# Altium footprint library pcb.PcbLib: 397 footprints (part 9 of 25)
Each footprint in its own frame and in the unit in brackets; x right, y up, seen from the top. Pads: shape width x height; smd on the part's side, far side on the other; paste and mask are expansions set on the pad; w line width, h text height; cw(c..) or ccw(c..) is an arc to the next point about the centre after c.
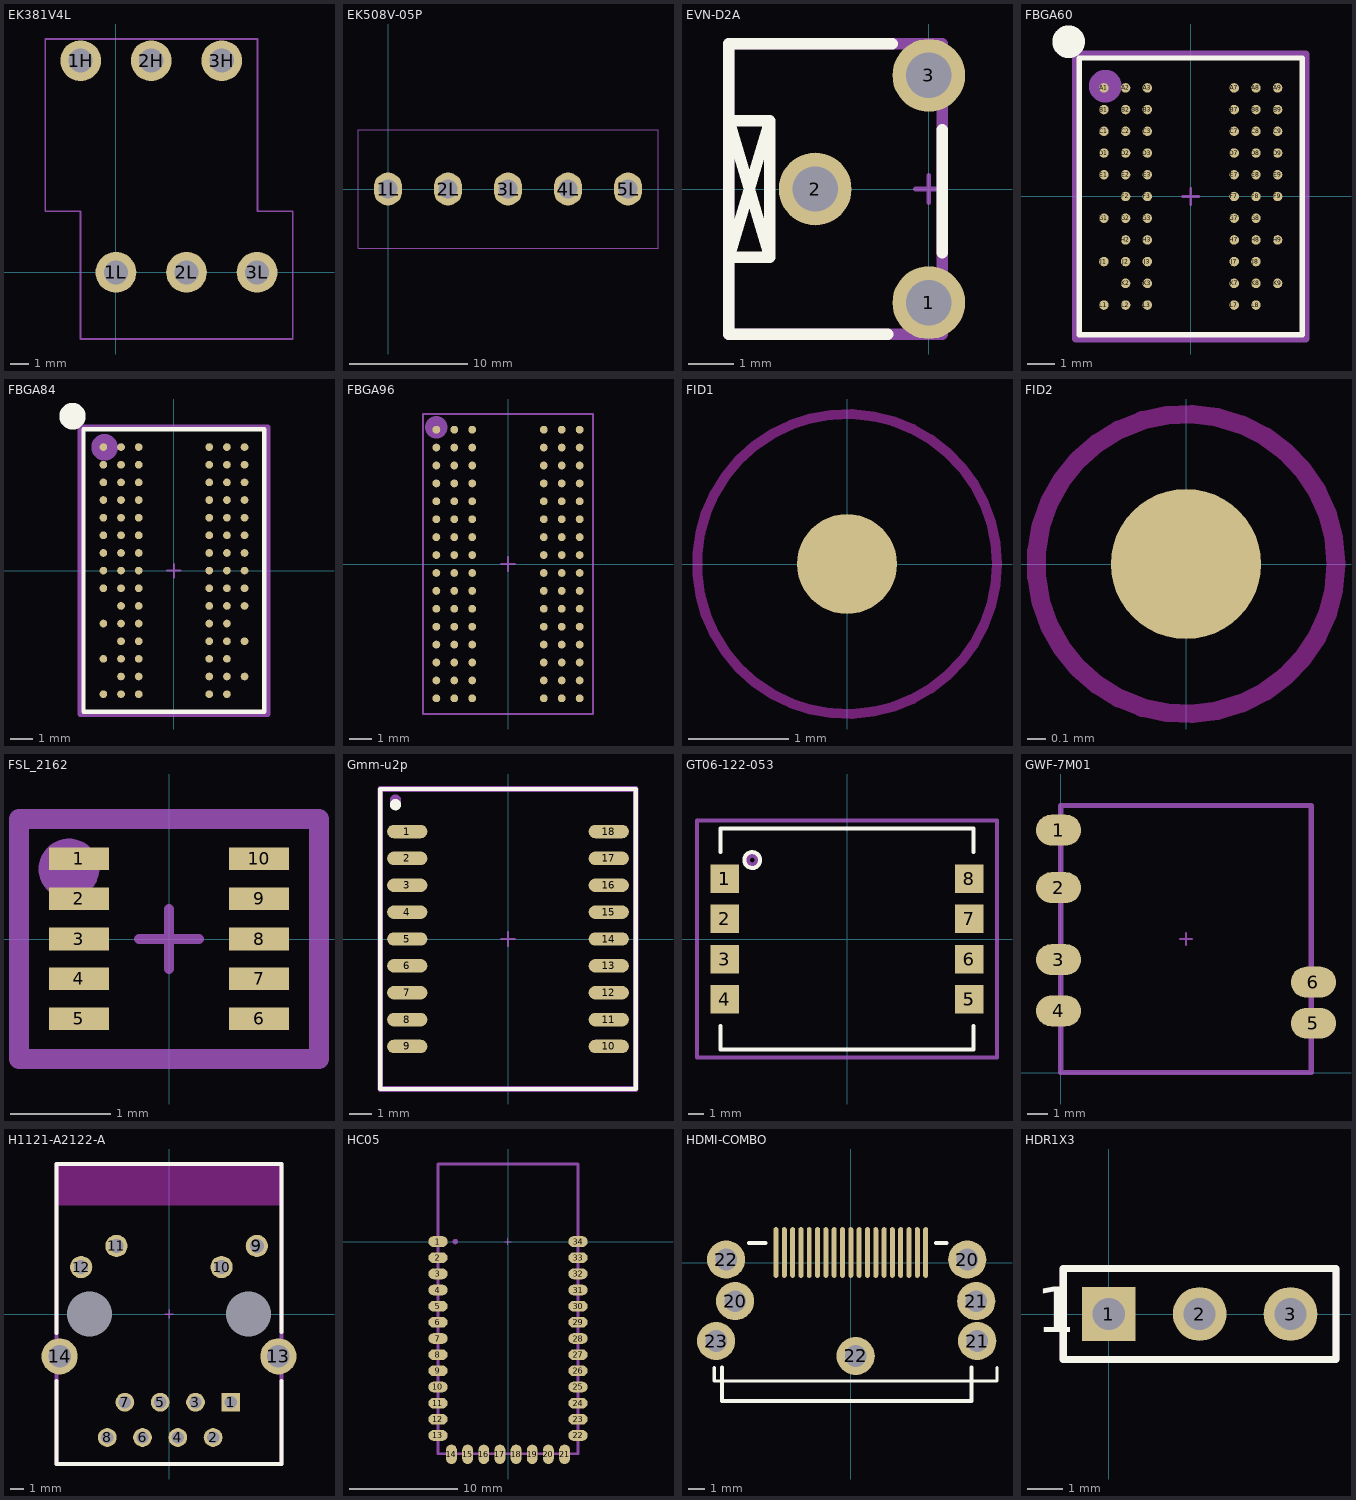
[diagram p8: the footprints below, top view; thin cyan lines are the x and y axes]

## EK381V4L [mm]
height 16.2
pads (6):
  round 2.2 hole 1.3: 1H(-1.905,11.43) 1L(0,0) 2H(1.905,11.43) 2L(3.81,0) 3H(5.715,11.43) 3L(7.62,0)
Mechanical 15:
  lines w0.1: -0.3,0 0.3,0 ; 0,-0.3 0,0.3 ; -3.82,3.3 -3.82,12.6 7.64,12.6 7.64,3.3 9.55,3.3 9.55,-3.6 -1.91,-3.6 -1.91,3.3 -3.82,3.3
  text ".Designator" at -1.3,-2.9 h1.02
3D body "EK381V4L.stp": height 16.2, standoff -3.5, extent -3.8,-3.6 9.54,12.6

## EK508V-05P [mm]
height 16.2
pads (5):
  oval 2.4x2.8 hole 1.6: 1L(0,0) 2L(5.08,0) 3L(10.16,0) 4L(15.24,0) 5L(20.32,0)
Mechanical 15:
  lines w0.1: -0.3,0 0.3,0 ; 0,-0.3 0,0.3 ; -2.54,-5 -2.54,5 22.86,5 22.86,-5 -2.54,-5
  text ".Designator" at -1.3,-2.9 h1.02
3D body: height 13.8, standoff 0, extent -2.54,-5 22.86,5

## EVN-D2A [mm]
height 8
pads (3):
  round 1.6 hole 1: 1(0,-2.5) 2(-2.5,0) 3(0,2.5)
Top Overlay:
  lines w0.25: -3.5,-1.5 -4.4,1.5 -3.5,1.5 ; -3.5,-1.5 -4.4,-1.5 -3.5,1.5 ; -3.5,-1.5 -3.5,1.5
  lines w0.254: -0.9,-3.2 -4.4,-3.2 -4.4,3.2 -0.8,3.2 ; 0.3,-1.4 0.3,1.3
Mechanical 15:
  lines w0.1: -0.3,0 0.3,0 ; 0,-0.3 0,0.3
  lines w0.254: -4.4,-3.2 0.3,-3.2 0.3,2 0.3,3.2 -4.4,3.2 -4.4,-3.2
  text ".Designator" at -1.1,-2.7 h1.02
3D body: height 8, standoff 0, extent -4.4,-3.2 0.3,3.2

## FBGA60 [mm]
height 1
pads (60):
  round 0.35 smd paste+0 mask+0.075: A1(-3.2,4) A2(-2.4,4) A3(-1.6,4) A7(1.6,4) A8(2.4,4) A9(3.2,4) B1(-3.2,3.2) B2(-2.4,3.2) B3(-1.6,3.2) B7(1.6,3.2) B8(2.4,3.2) B9(3.2,3.2) C1(-3.2,2.4) C2(-2.4,2.4) C3(-1.6,2.4) C7(1.6,2.4) C8(2.4,2.4) C9(3.2,2.4) D1(-3.2,1.6) D2(-2.4,1.6) D3(-1.6,1.6) D7(1.6,1.6) D8(2.4,1.6) D9(3.2,1.6) E1(-3.2,0.8) E2(-2.4,0.8) E3(-1.6,0.8) E7(1.6,0.8) E8(2.4,0.8) E9(3.2,0.8) F2(-2.4,0) F3(-1.6,0) F7(1.6,0) F8(2.4,0) F9(3.2,0) G1(-3.2,-0.8) G2(-2.4,-0.8) G3(-1.6,-0.8) G7(1.6,-0.8) G8(2.4,-0.8) H2(-2.4,-1.6) H3(-1.6,-1.6) H7(1.6,-1.6) H8(2.4,-1.6) H9(3.2,-1.6) J1(-3.2,-2.4) J2(-2.4,-2.4) J3(-1.6,-2.4) J7(1.6,-2.4) J8(2.4,-2.4) K2(-2.4,-3.2) K3(-1.6,-3.2) K7(1.6,-3.2) K8(2.4,-3.2) K9(3.2,-3.2) L1(-3.2,-4) L2(-2.4,-4) L3(-1.6,-4) L7(1.6,-4) L8(2.4,-4)
Top Overlay:
  circle w1: c-4.5,5.7 r0.1
  lines w0.2: -4.1,-5.1 -4.1,5.1 4.1,5.1 4.1,-5.1 -4.1,-5.1
Mechanical 15:
  circle w1: c-3.148,4.064 r0.1
  lines w0.1: -0.3,0 0.3,0 ; 0,-0.3 0,0.3
  lines w0.254: -4.25,-5.25 -4.25,5.25 4.25,5.25 4.25,-5.25 -4.25,-5.25
  text ".Designator" at -3.556,2.286 h1.02
3D body: height 1.55, standoff 0, extent -4,-5 4,5

## FBGA84 [mm]
height 1
pads (84):
  round 0.35 smd paste+0 mask+0.075: A1(-3.2,5.6) A2(-2.4,5.6) A3(-1.6,5.6) A7(1.6,5.6) A8(2.4,5.6) A9(3.2,5.6) B1(-3.2,4.8) B2(-2.4,4.8) B3(-1.6,4.8) B7(1.6,4.8) B8(2.4,4.8) B9(3.2,4.8) C1(-3.2,4) C2(-2.4,4) C3(-1.6,4) C7(1.6,4) C8(2.4,4) C9(3.2,4) D1(-3.2,3.2) D2(-2.4,3.2) D3(-1.6,3.2) D7(1.6,3.2) D8(2.4,3.2) D9(3.2,3.2) E1(-3.2,2.4) E2(-2.4,2.4) E3(-1.6,2.4) E7(1.6,2.4) E8(2.4,2.4) E9(3.2,2.4) F1(-3.2,1.6) F2(-2.4,1.6) F3(-1.6,1.6) F7(1.6,1.6) F8(2.4,1.6) F9(3.2,1.6) G1(-3.2,0.8) G2(-2.4,0.8) G3(-1.6,0.8) G7(1.6,0.8) G8(2.4,0.8) G9(3.2,0.8) H1(-3.2,0) H2(-2.4,0) H3(-1.6,0) H7(1.6,0) H8(2.4,0) H9(3.2,0) J1(-3.2,-0.8) J2(-2.4,-0.8) J3(-1.6,-0.8) J7(1.6,-0.8) J8(2.4,-0.8) J9(3.2,-0.8) K2(-2.4,-1.6) K3(-1.6,-1.6) K7(1.6,-1.6) K8(2.4,-1.6) K9(3.2,-1.6) L1(-3.2,-2.4) L2(-2.4,-2.4) L3(-1.6,-2.4) L7(1.6,-2.4) L8(2.4,-2.4) M2(-2.4,-3.2) M3(-1.6,-3.2) M7(1.6,-3.2) M8(2.4,-3.2) M9(3.2,-3.2) N1(-3.2,-4) N2(-2.4,-4) N3(-1.6,-4) N7(1.6,-4) N8(2.4,-4) P2(-2.4,-4.8) P3(-1.6,-4.8) P7(1.6,-4.8) P8(2.4,-4.8) P9(3.2,-4.8) R1(-3.2,-5.6) R2(-2.4,-5.6) R3(-1.6,-5.6) R7(1.6,-5.6) R8(2.4,-5.6)
Top Overlay:
  circle w1: c-4.6,7 r0.1
  lines w0.2: -4.1,-6.4 4.1,-6.4 4.1,6.4 -4.1,6.4 -4.1,-6.4
Mechanical 15:
  circle w1: c-3.148,5.588 r0.1
  lines w0.1: -0.3,0 0.3,0 ; 0,-0.3 0,0.3
  lines w0.254: -4.25,-6.5 -4.25,6.5 4.25,6.5 4.25,-6.5 -4.25,-6.5
  text ".Designator" at -3.556,3.302 h1.02
3D body: height 1.55, standoff 0, extent -4,-6.3 4,6.3

## FBGA96 [mm]
pads (96):
  round 0.35 smd paste+0 mask+0.075: A1(-3.2,6) A2(-2.4,6) A3(-1.6,6) A7(1.6,6) A8(2.4,6) A9(3.2,6) B1(-3.2,5.2) B2(-2.4,5.2) B3(-1.6,5.2) B7(1.6,5.2) B8(2.4,5.2) B9(3.2,5.2) C1(-3.2,4.4) C2(-2.4,4.4) C3(-1.6,4.4) C7(1.6,4.4) C8(2.4,4.4) C9(3.2,4.4) D1(-3.2,3.6) D2(-2.4,3.6) D3(-1.6,3.6) D7(1.6,3.6) D8(2.4,3.6) D9(3.2,3.6) E1(-3.2,2.8) E2(-2.4,2.8) E3(-1.6,2.8) E7(1.6,2.8) E8(2.4,2.8) E9(3.2,2.8) F1(-3.2,2) F2(-2.4,2) F3(-1.6,2) F7(1.6,2) F8(2.4,2) F9(3.2,2) G1(-3.2,1.2) G2(-2.4,1.2) G3(-1.6,1.2) G7(1.6,1.2) G8(2.4,1.2) G9(3.2,1.2) H1(-3.2,0.4) H2(-2.4,0.4) H3(-1.6,0.4) H7(1.6,0.4) H8(2.4,0.4) H9(3.2,0.4) J1(-3.2,-0.4) J2(-2.4,-0.4) J3(-1.6,-0.4) J7(1.6,-0.4) J8(2.4,-0.4) J9(3.2,-0.4) K1(-3.2,-1.2) K2(-2.4,-1.2) K3(-1.6,-1.2) K7(1.6,-1.2) K8(2.4,-1.2) K9(3.2,-1.2) L1(-3.2,-2) L2(-2.4,-2) L3(-1.6,-2) L7(1.6,-2) L8(2.4,-2) L9(3.2,-2) M1(-3.2,-2.8) M2(-2.4,-2.8) M3(-1.6,-2.8) M7(1.6,-2.8) M8(2.4,-2.8) M9(3.2,-2.8) N1(-3.2,-3.6) N2(-2.4,-3.6) N3(-1.6,-3.6) N7(1.6,-3.6) N8(2.4,-3.6) N9(3.2,-3.6) P1(-3.2,-4.4) P2(-2.4,-4.4) P3(-1.6,-4.4) P7(1.6,-4.4) P8(2.4,-4.4) P9(3.2,-4.4) R1(-3.2,-5.2) R2(-2.4,-5.2) R3(-1.6,-5.2) R7(1.6,-5.2) R8(2.4,-5.2) R9(3.2,-5.2) T1(-3.2,-6) T2(-2.4,-6) T3(-1.6,-6) T7(1.6,-6) T8(2.4,-6) T9(3.2,-6)
Mechanical 15:
  circle w1: c-3.2,6.1 r0
  lines w0.1: -0.3,0 0.3,0 ; 0,-0.3 0,0.3 ; -3.8,-6.7 -3.8,6.7 3.8,6.7 3.8,-6.7 -3.8,-6.7
  text ".Designator" at -3.6,4.4 h1.02
3D body: height 1.55, standoff 0, extent -3.8,-6.7 3.8,6.7

## FID1 [mm]
pads (1):
  round 1 smd paste-25.4 mask+1: ""(0,0)
Top Layer keep-out:
  circle w0.1: c0,0 r1.5

## FID2 [mm]
pads (1):
  round 0.8 smd paste-500 mask+0.4: ""(0,0)
Top Layer keep-out:
  circle w0.1: c0,0 r0.8

## FSL_2162 [mm]
height 0.8
pads (10):
  rect 0.6x0.225 smd paste-0.02 mask+0.1: 1(-0.9,0.8) 2(-0.9,0.4) 3(-0.9,0) 4(-0.9,-0.4) 5(-0.9,-0.8) 6(0.9,-0.8) 7(0.9,-0.4) 8(0.9,0) 9(0.9,0.4) 10(0.9,0.8)
Mechanical 15:
  circle w0.406: c-1,0.7 r0.1
  lines w0.1: -0.3,0 0.3,0 ; 0,-0.3 0,0.3
  lines w0.2: -1.5,-1.2 1.5,-1.2 1.5,1.2 -1.5,1.2 -1.5,-1.2
  text ".Designator" at -1.3,-0.9 h0.5
3D body: height 0.85, standoff 0, extent -1,-1 1,1

## Gmm-u2p [mm]
height 1.8
pads (18):
  oval 1.8x0.6 smd: 1(-4.5,4.8) 2(-4.5,3.6) 3(-4.5,2.4) 4(-4.5,1.2) 5(-4.5,0) 6(-4.5,-1.2) 7(-4.5,-2.4) 8(-4.5,-3.6) 9(-4.5,-4.8) 10(4.5,-4.8) 11(4.5,-3.6) 12(4.5,-2.4) 13(4.5,-1.2) 14(4.5,0) 15(4.5,1.2) 16(4.5,2.4) 17(4.5,3.6) 18(4.5,4.8)
Top Overlay:
  circle w0.25: c-5.025,6 r0.125
  lines w0.2: -5.7,-6.7 -5.7,6.7 5.7,6.7 5.7,-6.7 -5.7,-6.7
Mechanical 15:
  circle w0.25: c-5.025,6.2 r0.125
  lines w0.1: -0.3,0 0.3,0 ; 0,-0.3 0,0.3
  lines w0.254: -5.7,-6.7 5.7,-6.7 5.7,6.7 -5.7,6.7 -5.7,-6.7
  text ".Designator" at -5.1,-5.2 h1.02
3D body: height 2.1, standoff 0, extent -4.5,-6.4 4.5,6.4

## GT06-122-053 [mm] "Pulse Transformers Gate Drive Transformer"
pads (10):
  rect 1.8x1.8 smd: 1(-7.75,3.81) 1(-7.75,3.81) 2(-7.75,1.27) 3(-7.75,-1.27) 4(-7.75,-3.81) 5(7.75,-3.81) 5(7.75,-3.81) 6(7.75,-1.27) 7(7.75,1.27) 8(7.75,3.81)
Top Overlay:
  circle w0.254: c-6,5 r0.5
  lines w0.254: -8,-5.5 -8,-7 8,-7 8,-5.5 ; -8,5.5 -8,7 8,7 8,5.5
Mechanical 15:
  circle w0.3: c-6,5 r0.3
  lines w0.254: 7.2,7.5 9.5,7.5 9.5,-7.5 8.9,-7.5 -9.5,-7.5 -9.5,5.5 -9.5,7.5 8,7.5
  text ".Designator" at -5.1,2.3 h1.02
  text "1" at -6.1,3.2 h1.02
3D body: height 7.5, standoff 0.5, extent -7.747,-6.985 7.747,6.985

## GWF-7M01 [mm]
height 2
pads (6):
  oval 2.2x1.5 smd: 1(-0.1,11.8) 2(-0.1,9) 3(-0.1,5.5) 4(-0.1,3) 5(12.3,2.4) 6(12.3,4.4)
Mechanical 15:
  lines w0.1: 5.8,6.5 6.4,6.5 ; 6.1,6.2 6.1,6.8
  lines w0.254: 0,0 0,13 12.2,13 12.2,0 0,0
  text ".Designator" at 1.2,3.3 h1.02
3D body: height 2, standoff 0, extent 0,0 12.2,13

## H1121-A2122-A [mm]
height 13.8
pads (16):
  rect 1.35x1.35 hole 0.89: 1(4.445,-6.35)
  round 1.35 hole 0.89: 2(3.175,-8.89) 3(1.905,-6.35) 4(0.635,-8.89) 5(-0.635,-6.35) 6(-1.905,-8.89) 7(-3.175,-6.35) 8(-4.445,-8.89)
  round 1.6 hole 1: 9(6.325,4.9) 10(3.785,3.38) 11(-3.785,4.9) 12(-6.325,3.38)
  round 2.6 hole 1.63: 13(7.875,-3.05) 14(-7.875,-3.05)
  round 0 hole 3.25 unplated: ""(-5.715,0) ""(5.715,0)
Top Layer keep-out:
  region: 8.1,10.8 -8.1,10.8 -8.1,7.8 8.1,7.8
Top Overlay:
  lines w0.254: -8.1,-4.82 -8.1,-10.8 8.1,-10.8 8.1,-4.82 ; -8.1,-1.4 -8.1,10.8 8.1,10.8 8.1,-1.3
Mechanical 15:
  lines w0.1: -0.3,0 0.3,0 ; 0,-0.3 0,0.3
  lines w0.254: -8.1,-10.8 -8.1,10.8 8.1,10.8 8.1,-10.8 -8.1,-10.8
  text ".Designator" at -5.1,-4.5 h1.02

## HC05 [mm]
height 1.8
pads (34):
  oval 1.8x1 smd: 1(-6.5,0) 2(-6.5,-1.5) 3(-6.5,-3) 4(-6.5,-4.5) 5(-6.5,-6) 6(-6.5,-7.5) 7(-6.5,-9) 8(-6.5,-10.5) 9(-6.5,-12) 10(-6.5,-13.5) 11(-6.5,-15) 12(-6.5,-16.5) 13(-6.5,-18) 22(6.5,-18) 23(6.5,-16.5) 24(6.5,-15) 25(6.5,-13.5) 26(6.5,-12) 27(6.5,-10.5) 28(6.5,-9) 29(6.5,-7.5) 30(6.5,-6) 31(6.5,-4.5) 32(6.5,-3) 33(6.5,-1.5) 34(6.5,0)
  oval 1x1.8 smd: 14(-5.25,-19.75) 15(-3.75,-19.75) 16(-2.25,-19.75) 17(-0.75,-19.75) 18(0.75,-19.75) 19(2.25,-19.75) 20(3.75,-19.75) 21(5.25,-19.75)
Mechanical 15:
  circle w0.25: c-4.9,0 r0.125
  lines w0.1: -0.3,0 0.3,0 ; 0,-0.3 0,0.3
  lines w0.254: -6.5,-19.7 6.5,-19.7 6.5,7.2 -6.5,7.2 -6.5,-19.7
  text ".Designator" at -4.3,-7 h1.02
3D body "User Library-Bluetooth HC-06_.STEP": height 2.35, standoff 0, extent -7.02,-19.75 7,8.26

## HDMI-COMBO [mm]
height 8.5
pads (26):
  oval 0.3x3.05 smd: 1(4.5,0.625) 2(4,0.625) 3(3.5,0.625) 4(3,0.625) 5(2.5,0.625) 6(2,0.625) 7(1.5,0.625) 8(1,0.625) 9(0.5,0.625) 10(0,0.625) 11(-0.5,0.625) 12(-1,0.625) 13(-1.5,0.625) 14(-2,0.625) 15(-2.5,0.625) 16(-3,0.625) 17(-3.5,0.625) 18(-4,0.625) 19(-4.5,0.625)
  round 2.3 hole 1.3: 20(-6.96,-2.3) 20(7,0.2) 21(7.54,-2.3) 21(7.6,-4.7) 22(-7.5,0.2) 22(0.29,-5.6) 23(-8.1,-4.7)
Top Overlay:
  lines w0.2: -8.21,-6.3 -8.21,-7.1 8.79,-7.1 8.79,-6.3
  lines w0.254: -7.75,-6.3 -7.75,-7.925 -7.75,-8.3 7.25,-8.3 7.25,-6.3 ; -6.125,1.2 -5.125,1.2 ; 5.125,1.2 5.75,1.2 ; 7.25,-3.05 7.25,-1.425
3D body "472662201.stp": height 6.28, standoff -1.73, extent -8.35,-8.4 7.85,1.45
3D body "476591000.stp": height 8.5, standoff -3, extent -7.21,-7 7.79,0.545

## HDR1X3 [mm] "Connector; Header; 3x1 Position"
height 1
pads (3):
  rect 1.5x1.5 hole 0.9: 1(0,0)
  round 1.5 hole 0.9: 2(2.54,0) 3(5.08,0)
Top Overlay:
  lines w0.2: 1.482,-1.27 6.35,-1.27 ; 6.35,-1.27 6.35,1.27 -1.27,1.27 -1.27,-1.27 6.35,-1.27
  text "1" at -2.032,-0.508 h1.27
Mechanical 15:
  lines w0.1: -0.3,0 0.3,0 ; 0,-0.3 0,0.3
  lines w0.2: -1.27,-1.27 -1.27,1.27 6.35,1.27 6.35,-1.27 -1.27,-1.27
  text ".Designator" at 0,0 h1.02